# Altium footprint library HW_HOLLAND_NCDM_MONITOR_R1.PcbLib: 472 footprints (part 15 of 30)
Each footprint in its own frame and in the unit in brackets; x right, y up, seen from the top. Pads: shape width x height; smd on the part's side, far side on the other; paste and mask are expansions set on the pad; w line width, h text height; cw(c..) or ccw(c..) is an arc to the next point about the centre after c.
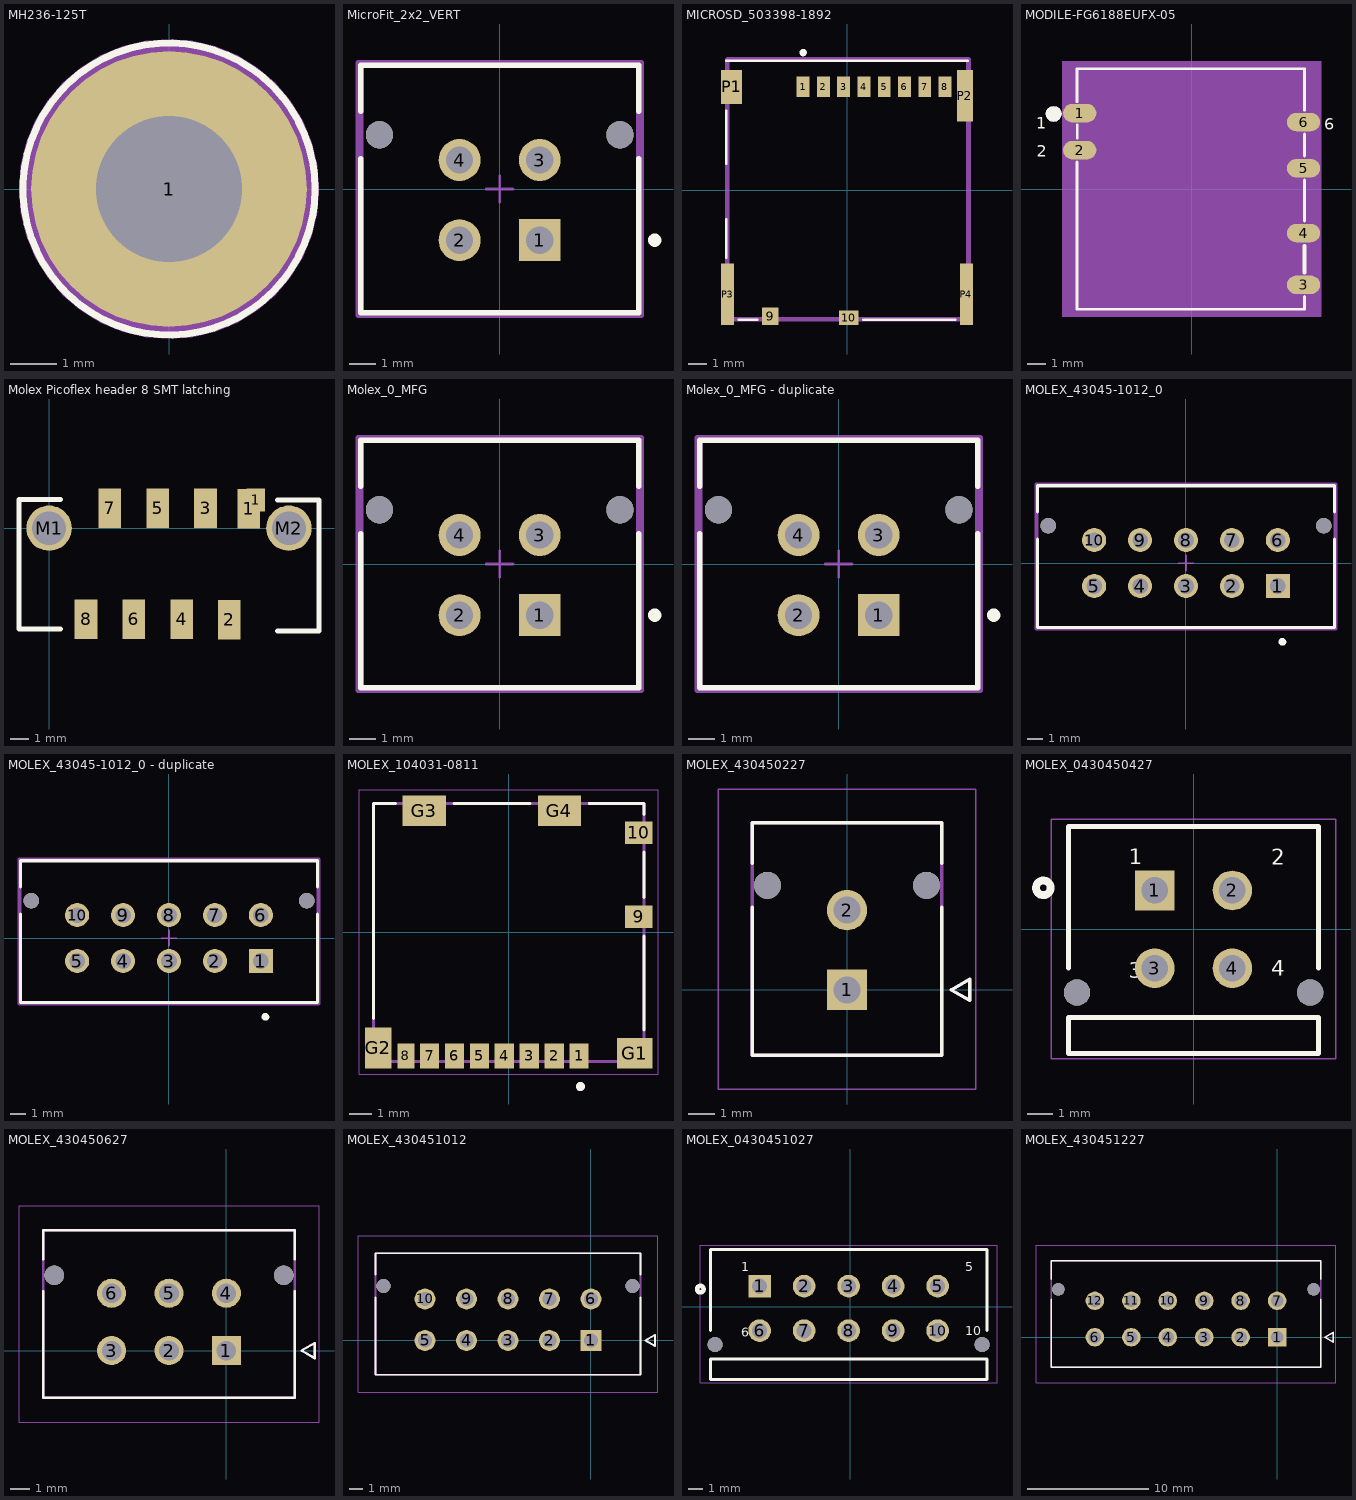
[diagram p14: the footprints below, top view; thin cyan lines are the x and y axes]

## MH236-125T [mil]
pads (1):
  round 236 hole 125: 1(0,0)
Top Overlay:
  circle w6: c0,0 r125.01
  text ".Designator" at -40,8.34 h25
Top Assembly:
  circle w6: c0,0 r118
  text ".Designator" at -40,8.34 h25
Top 3D Body:
  region: 118.36,0 116.91,-18.52 112.57,-36.58 105.46,-53.74 95.76,-69.57 83.7,-83.7 69.57,-95.76 53.74,-105.46 36.58,-112.57 18.52,-116.91 0,-118.36 -18.52,-116.91 -36.58,-112.57 -53.74,-105.46 -59.02,-102.23 -69.57,-95.76 -83.7,-83.7 -95.76,-69.57 -105.46,-53.74 -112.57,-36.58 -116.91,-18.52 -118.36,0 -116.91,18.52 -112.57,36.58 -105.46,53.74 -95.76,69.57 -83.7,83.7 -69.57,95.76 -59.02,102.23 -53.74,105.46 -36.58,112.57 -18.52,116.91 0,118.36 18.52,116.91 36.58,112.57 53.74,105.46 69.57,95.76 83.7,83.7 95.76,69.57 105.46,53.74 112.57,36.58 116.91,18.52
Bottom 3D Body:
  region: 118.36,0 116.91,-18.52 112.57,-36.58 105.46,-53.74 95.76,-69.57 83.7,-83.7 69.57,-95.76 53.74,-105.46 36.58,-112.57 18.52,-116.91 0,-118.36 -18.52,-116.91 -36.58,-112.57 -53.74,-105.46 -59.02,-102.23 -69.57,-95.76 -83.7,-83.7 -95.76,-69.57 -105.46,-53.74 -112.57,-36.58 -116.91,-18.52 -118.36,0 -116.91,18.52 -112.57,36.58 -105.46,53.74 -95.76,69.57 -83.7,83.7 -69.57,95.76 -59.02,102.23 -53.74,105.46 -36.58,112.57 -18.52,116.91 0,118.36 18.52,116.91 36.58,112.57 53.74,105.46 69.57,95.76 83.7,83.7 95.76,69.57 105.46,53.74 112.57,36.58 116.91,18.52
Top Component Center:
  lines w1: -10,0 10,0 ; 0,-10 0,10
Top Courtyard:
  dashed: 118.36,0 116.91,-18.52 112.57,-36.58 105.46,-53.74 95.76,-69.57 83.7,-83.7 69.57,-95.76 53.74,-105.46 36.58,-112.57 18.52,-116.91 0,-118.36 -18.52,-116.91 -36.58,-112.57 -53.74,-105.46 -59.02,-102.23 -69.57,-95.76 -83.7,-83.7 -95.76,-69.57 -105.46,-53.74 -112.57,-36.58 -116.91,-18.52 -118.36,0 -116.91,18.52 -112.57,36.58 -105.46,53.74 -95.76,69.57 -83.7,83.7 -69.57,95.76 -59.02,102.23 -53.74,105.46 -36.58,112.57 -18.52,116.91 0,118.36 18.52,116.91 36.58,112.57 53.74,105.46 69.57,95.76 83.7,83.7 95.76,69.57 105.46,53.74 112.57,36.58 116.91,18.52
Bottom Courtyard:
  dashed: 118.36,0 116.91,-18.52 112.57,-36.58 105.46,-53.74 95.76,-69.57 83.7,-83.7 69.57,-95.76 53.74,-105.46 36.58,-112.57 18.52,-116.91 0,-118.36 -18.52,-116.91 -36.58,-112.57 -53.74,-105.46 -59.02,-102.23 -69.57,-95.76 -83.7,-83.7 -95.76,-69.57 -105.46,-53.74 -112.57,-36.58 -116.91,-18.52 -118.36,0 -116.91,18.52 -112.57,36.58 -105.46,53.74 -95.76,69.57 -83.7,83.7 -69.57,95.76 -59.02,102.23 -53.74,105.46 -36.58,112.57 -18.52,116.91 0,118.36 18.52,116.91 36.58,112.57 53.74,105.46 69.57,95.76 83.7,83.7 95.76,69.57 105.46,53.74 112.57,36.58 116.91,18.52
Mechanical 17:
  text "1" at -14.4,0 h18
Mechanical 23:
  dashed: 128.4,0 126.81,-20.09 122.11,-39.68 114.4,-58.29 103.87,-75.47 90.79,-90.79 75.47,-103.87 58.29,-114.4 39.68,-122.11 20.09,-126.81 0,-128.4 -20.09,-126.81 -39.68,-122.11 -58.29,-114.4 -64.02,-110.89 -75.47,-103.87 -90.79,-90.79 -103.87,-75.47 -114.4,-58.29 -122.11,-39.68 -126.81,-20.09 -128.4,0 -126.81,20.09 -122.11,39.68 -114.4,58.29 -103.87,75.47 -90.79,90.79 -75.47,103.87 -64.02,110.89 -58.29,114.4 -39.68,122.11 -20.09,126.81 0,128.4 20.09,126.81 39.68,122.11 58.29,114.4 75.47,103.87 90.79,90.79 103.87,75.47 114.4,58.29 122.11,39.68 126.81,20.09
Mechanical 25:
  dashed: 128.4,0 126.81,-20.09 122.11,-39.68 114.4,-58.29 103.87,-75.47 90.79,-90.79 75.47,-103.87 58.29,-114.4 39.68,-122.11 20.09,-126.81 0,-128.4 -20.09,-126.81 -39.68,-122.11 -58.29,-114.4 -64.02,-110.89 -75.47,-103.87 -90.79,-90.79 -103.87,-75.47 -114.4,-58.29 -122.11,-39.68 -126.81,-20.09 -128.4,0 -126.81,20.09 -122.11,39.68 -114.4,58.29 -103.87,75.47 -90.79,90.79 -75.47,103.87 -64.02,110.89 -58.29,114.4 -39.68,122.11 -20.09,126.81 0,128.4 20.09,126.81 39.68,122.11 58.29,114.4 75.47,103.87 90.79,90.79 103.87,75.47 114.4,58.29 122.11,39.68 126.81,20.09
3D body: height 150, standoff 0, extent -118.36,-118.36 118.36,118.36
3D body: height 150, standoff 0, extent -118.36,-118.36 118.36,118.36

## MicroFit_2x2_VERT [mm]
pads (6):
  rect 1.57x1.57 hole 1.02 paste-2539.97 mask+0: 1(1.5,-1.915)
  round 1.57 hole 1.02 paste-2539.97 mask+0: 2(-1.5,-1.915) 3(1.5,1.085) 4(-1.5,1.085)
  round 1.02 hole 1.02 unplated paste-2539.97 mask+0: ""(-4.5,2.025) ""(4.5,2.025)
Top Overlay:
  circle w0.25: c5.8,-1.915 r0.125
  lines w0.2: -5.2,1.14 -5.2,-4.635 5.2,-4.635 5.2,1.14 ; -5.2,2.91 -5.2,4.635 5.2,4.635 5.2,2.91
Top Courtyard:
  lines w0.2: -5.3,-4.735 5.3,-4.735 5.3,4.735 -5.3,4.735 -5.3,-4.735
  text ".Designator" at 0,0.046 h1.25
Mechanical 12:
  lines w0.2: -5.2,-4.635 5.2,-4.635 5.2,4.635 -5.2,4.635 -5.2,-4.635
Mechanical 15:
  lines w0.1: -0.5,0 0.5,0 ; 0,-0.5 0,0.5
  lines w0.2: -5.3,-4.735 5.3,-4.735 5.3,4.735 -5.3,4.735 -5.3,-4.735
3D body "Conn_Molex_43045-0427_eec.STEP": height 0.25, standoff 0, extent -5.3,-4.735 5.3,4.735

## MICROSD_503398-1892 [mm]
height 0.52
pads (14):
  rect 0.7x1.1 smd: 1(-2.38,5.625) 2(-1.28,5.625) 3(-0.18,5.625) 4(0.92,5.625) 5(2.02,5.625) 6(3.12,5.625) 7(4.22,5.625) 8(5.32,5.625)
  rect 0.9x0.93 smd: 9(-4.17,-6.84)
  rect 1.05x0.78 smd: 10(0.095,-6.915)
  rect 1.14x1.83 smd: P1(-6.26,5.61)
  rect 0.86x2.8 smd: P2(6.4,5.125)
  rect 0.7x3.33 smd: P3(-6.48,-5.64) P4(6.48,-5.64)
Top Overlay:
  circle w0.2: c-2.38,7.475 r0.1
  lines w0.127: -6.55,-3.675 -6.55,-1.575 ; -6.55,1.425 -6.55,4.325 ; -6.55,7.025 6.55,7.025 ; -5.876,-7.025 -4.874,-7.025 ; 0.874,-7.025 5.876,-7.025
Mechanical 13:
  circle w0.2: c-2.38,5.775 r0.1
  lines w0.127: -6.55,-7.025 -6.55,7.025 6.55,7.025 6.55,-7.025 -6.55,-7.025
Top Designator:
  lines w0.254: -6.5,-7 6.6,-7 6.6,7.1 -6.5,7.1 -6.5,-7
  text ".Designator" at -4.835,-0.634 h1
3D body "5033981892.stp": height 1.28, standoff 0, extent -6.5,-7.025 6.6,7.025

## MODILE-FG6188EUFX-05 [mm]
pads (6):
  oval 1.8x1 smd: 1(-6.05,4.1) 2(-6.05,2.1) 3(6.05,-5.18) 4(6.05,-2.38) 5(6.05,1.12) 6(6.05,3.62)
Top Overlay:
  dashed: -7.034,4.06 -7.066,4.221 -7.158,4.358 -7.294,4.449 -7.456,4.481 -7.617,4.449 -7.663,4.419 -7.754,4.358 -7.845,4.221 -7.877,4.06 -7.845,3.898 -7.754,3.761 -7.663,3.701 -7.617,3.67 -7.456,3.638 -7.294,3.67 -7.158,3.761 -7.066,3.898
  lines w0.152: -6.2,4.717 -6.2,6.5 6.1,6.5 6.1,4.252 ; -6.193,1.468 -6.2,-6.5 6.1,-6.5 6.1,-5.817 ; -6.186,2.74 -6.186,3.473 ; 6.095,1.784 6.095,2.971 ; 6.104,-1.734 6.104,0.478
  lines w0.203: 6.095,-4.511 6.1,-3.063
  text "6" at 7.167,3.19 h0.64
  text "1" at -8.412,3.247 h0.64
  text "2" at -8.369,1.736 h0.64
  text ".Designator" at -0.953,-0.212 h0.64
Top Assembly:
  dashed: -7.034,4.06 -7.066,4.221 -7.158,4.358 -7.294,4.449 -7.456,4.481 -7.617,4.449 -7.663,4.419 -7.754,4.358 -7.845,4.221 -7.877,4.06 -7.845,3.898 -7.754,3.761 -7.663,3.701 -7.617,3.67 -7.456,3.638 -7.294,3.67 -7.158,3.761 -7.066,3.898
  lines w0.025: -6.1,-6.5 6.1,-6.5 6.1,6.5 -6.1,6.5 -6.1,-6.5
Top 3D Body:
  region: -7,6.9 7,6.9 7,-6.9 -7,-6.9
Mechanical 17:
  text "3" at 5.867,-5.18 h0.46
  text "4" at 5.867,-2.38 h0.46
  text "5" at 5.867,1.12 h0.46
  text "2" at -6.233,2.1 h0.46
  text "1" at -6.233,4.1 h0.46
  text "6" at 5.867,3.62 h0.46
3D body: height 3.81, standoff 0, extent -7,-6.9 7,6.9

## Molex Picoflex header 8 SMT latching [mm]
pads (11):
  rect 1.2x2.1 smd: 1(10.617,1.041) 2(9.58,-4.855) 3(8.31,1.05) 4(7.04,-4.845) 5(5.77,1.05) 6(4.5,-4.845) 7(3.23,1.05) 8(1.96,-4.845)
  rect 1x1.2 smd: 1(10.977,1.499)
  round 2.413 hole 1.8 mask-0.3: M1(0,0) M2(12.74,0)
Top Overlay:
  lines w0.254: 0.6,-5.359 -1.6,-5.359 -1.6,1.524 0.6,1.524 ; 12.14,-5.461 14.34,-5.461 14.34,1.499 12.14,1.499
3D body "908163008.stp": height 8.45, standoff -1.25, extent -1.595,-5.375 14.345,1.545

## Molex_0_MFG [mm]
pads (6):
  rect 1.57x1.57 hole 1.02 paste-2539.97 mask+0: 1(1.5,-1.915)
  round 1.57 hole 1.02 paste-2539.97 mask+0: 2(-1.5,-1.915) 3(1.5,1.085) 4(-1.5,1.085)
  round 1.02 hole 1.02 unplated paste-2539.97 mask+0: ""(-4.5,2.025) ""(4.5,2.025)
Top Overlay:
  circle w0.25: c5.8,-1.915 r0.125
  lines w0.2: -5.2,1.14 -5.2,-4.635 5.2,-4.635 5.2,1.14 ; -5.2,2.91 -5.2,4.635 5.2,4.635 5.2,2.91
Top Courtyard:
  lines w0.2: -5.3,-4.735 -5.3,4.735 5.3,4.735 5.3,-4.735 -5.3,-4.735
  text ".Designator" at 0,0 h1
Mechanical 12:
  lines w0.2: -5.2,-4.635 -5.2,4.635 5.2,4.635 5.2,-4.635 -5.2,-4.635
Mechanical 15:
  lines w0.1: -0.5,0 0.5,0 ; 0,-0.5 0,0.5
  lines w0.2: -5.3,-4.735 -5.3,4.735 5.3,4.735 5.3,-4.735 -5.3,-4.735
3D body "Conn_Molex_43045-0427_eec.STEP": height 0.25, standoff 0, extent -5.3,-4.735 5.3,4.735

## Molex_0_MFG - duplicate [mm]
pads (6):
  rect 1.57x1.57 hole 1.02 paste-2539.97 mask+0: 1(1.5,-1.915)
  round 1.57 hole 1.02 paste-2539.97 mask+0: 2(-1.5,-1.915) 3(1.5,1.085) 4(-1.5,1.085)
  round 1.02 hole 1.02 unplated paste-2539.97 mask+0: ""(-4.5,2.025) ""(4.5,2.025)
Top Overlay:
  circle w0.25: c5.8,-1.915 r0.125
  lines w0.2: -5.2,1.14 -5.2,-4.635 5.2,-4.635 5.2,1.14 ; -5.2,2.91 -5.2,4.635 5.2,4.635 5.2,2.91
Top Courtyard:
  lines w0.2: -5.3,-4.735 -5.3,4.735 5.3,4.735 5.3,-4.735 -5.3,-4.735
  text ".Designator" at 0,0 h1
Mechanical 12:
  lines w0.2: -5.2,-4.635 -5.2,4.635 5.2,4.635 5.2,-4.635 -5.2,-4.635
Mechanical 15:
  lines w0.1: -0.5,0 0.5,0 ; 0,-0.5 0,0.5
  lines w0.2: -5.3,-4.735 -5.3,4.735 5.3,4.735 5.3,-4.735 -5.3,-4.735
3D body "Conn_Molex_43045-0427_eec.STEP": height 0.25, standoff 0, extent -5.3,-4.735 5.3,4.735

## MOLEX_43045-1012_0 [mm]
pads (12):
  rect 1.57x1.57 hole 1.02 paste-2539.97 mask+0: 1(6,-1.5)
  round 1.57 hole 1.02 paste-2539.97 mask+0: 2(3,-1.5) 3(0,-1.5) 4(-3,-1.5) 5(-6,-1.5) 6(6,1.5) 7(3,1.5) 8(0,1.5) 9(-3,1.5) 10(-6,1.5)
  round 1.02 hole 1.02 unplated paste-2539.97 mask+0: ""(-9,2.44) ""(9,2.44)
Top Overlay:
  circle w0.25: c6.3,-5.15 r0.125
  lines w0.2: -9.7,1.555 -9.7,-4.22 9.7,-4.22 9.7,1.555 ; -9.7,3.325 -9.7,5.05 9.7,5.05 9.7,3.325
Top Courtyard:
  lines w0.2: -9.8,-4.32 9.8,-4.32 9.8,5.15 -9.8,5.15 -9.8,-4.32
  text ".Designator" at 0,0.415 h1
Mechanical 12:
  lines w0.15: -9.7,-4.22 9.7,-4.22 9.7,5.05 -9.7,5.05 -9.7,-4.22
Mechanical 15:
  lines w0.1: -0.5,0 0.5,0 ; 0,-0.5 0,0.5
  lines w0.2: -9.8,-4.32 9.8,-4.32 9.8,5.15 -9.8,5.15 -9.8,-4.32
3D body "Conn_Molex_43045-1012_eec.STEP": height 9.91, standoff -3.18, extent -9.575,-3.967 9.575,4.803

## MOLEX_43045-1012_0 - duplicate [mm]
pads (12):
  rect 1.57x1.57 hole 1.02 paste-2539.97 mask+0: 1(6,-1.5)
  round 1.57 hole 1.02 paste-2539.97 mask+0: 2(3,-1.5) 3(0,-1.5) 4(-3,-1.5) 5(-6,-1.5) 6(6,1.5) 7(3,1.5) 8(0,1.5) 9(-3,1.5) 10(-6,1.5)
  round 1.02 hole 1.02 unplated paste-2539.97 mask+0: ""(-9,2.44) ""(9,2.44)
Top Overlay:
  circle w0.25: c6.3,-5.15 r0.125
  lines w0.2: -9.7,1.555 -9.7,-4.22 9.7,-4.22 9.7,1.555 ; -9.7,3.325 -9.7,5.05 9.7,5.05 9.7,3.325
Top Courtyard:
  lines w0.2: -9.8,-4.32 9.8,-4.32 9.8,5.15 -9.8,5.15 -9.8,-4.32
  text ".Designator" at 0,0.415 h1
Mechanical 12:
  lines w0.15: -9.7,-4.22 9.7,-4.22 9.7,5.05 -9.7,5.05 -9.7,-4.22
Mechanical 15:
  lines w0.1: -0.5,0 0.5,0 ; 0,-0.5 0,0.5
  lines w0.2: -9.8,-4.32 9.8,-4.32 9.8,5.15 -9.8,5.15 -9.8,-4.32
3D body "Conn_Molex_43045-1012_eec.STEP": height 9.91, standoff -3.18, extent -9.575,-3.967 9.575,4.803

## MOLEX_104031-0811 [mm]
height 1.57
pads (14):
  rect 0.85x1.1 smd: 1(3.105,-5.45) 2(2.005,-5.45) 3(0.905,-5.45) 4(-0.195,-5.45) 5(-1.295,-5.45) 6(-2.395,-5.45) 7(-3.495,-5.45)
  rect 0.75x1.1 smd: 8(-4.545,-5.45)
  rect 1.2x1 smd: 9(5.74,0.7) 10(5.74,4.4)
  rect 1.55x1.35 smd: G1(5.565,-5.325)
  rect 1.17x1.8 smd: G2(-5.755,-5.1)
  rect 1.9x1.35 smd: G3(-3.73,5.375) G4(2.24,5.375)
Top Overlay:
  circle w0.2: c3.168,-6.801 r0.1
  lines w0.127: -5.975,-3.806 -5.975,5.7 -5.003,5.7 ; -2.413,5.7 0.939,5.7 ; 3.556,5.7 5.975,5.7 5.975,5.211 ; 5.975,-4.3 5.975,-0.15 ; 5.975,1.55 5.975,3.55
Mechanical 13:
  circle w0.2: c3.168,-6.801 r0.1
  lines w0.127: -5.975,-5.7 5.975,-5.7 5.975,5.7 -5.975,5.7 -5.975,-5.7
Mechanical 15:
  lines w0.05: -6.59,-6.25 6.59,-6.25 6.59,6.3 -6.59,6.3 -6.59,-6.25
3D body "1040310811.stp": height 1.43, standoff -0.02, extent -5.975,-5.7 5.975,5.7

## MOLEX_430450227 [mm]
height 9.91
pads (4):
  rect 1.52x1.52 / inner round 1.52 / far side rect 1.52x1.52 hole 1.02 mask+0.076: 1(0,0)
  round 1.52 hole 1.02 mask+0.076: 2(0,3)
  round 1.02 hole 1.02 unplated mask+0.076: ""(-3,3.94) ""(3,3.94)
Top Overlay:
  lines w0.127: -3.575,3.11 -3.575,-2.47 3.575,-2.47 3.575,3.11 ; -3.575,4.77 -3.575,6.3 3.575,6.3 3.575,4.77 ; 3.93,0 4.63,-0.4 4.63,0.4 3.93,0
Mechanical 13:
  lines w0.127: -3.575,-2.47 -3.575,6.3 3.575,6.3 3.575,-2.47 -3.575,-2.47 ; 3.93,0 4.63,-0.4 4.63,0.4 3.93,0
  text "NPTH D1.02 +/- 0.05" at -3.5,-6.24 h0.5
  text "PTH D1.02 +/- 0.05" at -3.5,-5.47 h0.5
Mechanical 15:
  lines w0.05: -4.845,-3.74 -4.845,7.57 4.845,7.57 4.845,-3.74 -4.845,-3.74
3D body "430450227.step": height 9.92, standoff -3.17, extent -3.575,-2.47 3.575,6.3

## MOLEX_0430450427 [mm]
pads (6):
  rect 1.53x1.53 hole 1.02: 1(-1.5,1.5)
  round 1.53 hole 1.02: 2(1.5,1.5) 3(-1.5,-1.5) 4(1.5,-1.5)
  round 1.02 hole 1.02 unplated: ""(-4.5,-2.44) ""(4.5,-2.44)
Top Overlay:
  circle w0.3: c-5.8,1.6 r0.283
  lines w0.2: -4.825,-1.5 -4.825,3.97 4.825,3.97 4.825,-1.5 ; -4.825,-4.8 -4.825,-3.4 4.825,-3.4 4.825,-4.8 -4.825,-4.8
  text "4" at 3.003,-1.802 h0.61
  text "3" at -2.5,-1.9 h0.61
  text "2" at 3.002,2.501 h0.61
  text "1" at -2.503,2.503 h0.61
Mechanical 15:
  lines w0.05: -5.5,-5 -5.5,4.25 5.5,4.25 5.5,-5 -5.5,-5
3D body "step_temp.STEP": height 9.92, standoff -3.17, extent -5.075,-4.833 5.075,3.937

## MOLEX_430450627 [mm]
height 9.91
pads (8):
  rect 1.52x1.52 / inner round 1.52 / far side rect 1.52x1.52 hole 1.02 mask+0.076: 1(0,0)
  round 1.52 hole 1.02 mask+0.076: 2(-3,0) 3(-6,0) 4(0,3) 5(-3,3) 6(-6,3)
  round 1.02 hole 1.02 unplated mask+0.076: ""(-9,3.94) ""(3,3.94)
Top Overlay:
  lines w0.127: -9.575,3.11 -9.575,-2.47 3.575,-2.47 3.575,3.11 ; -9.575,4.77 -9.575,6.3 3.575,6.3 3.575,4.77 ; 3.93,0 4.63,0.4 4.63,-0.4 3.93,0
Mechanical 13:
  lines w0.127: -9.575,-2.47 3.575,-2.47 3.575,6.3 -9.575,6.3 -9.575,-2.47 ; 3.93,0 4.63,0.4 4.63,-0.4 3.93,0
  text "PTH D1.02 +/- 0.05" at -9.5,-5.47 h0.5
  text "NPTH D1.02 +/- 0.05" at -9.5,-6.24 h0.5
Mechanical 15:
  lines w0.05: -10.845,-3.74 4.845,-3.74 4.845,7.57 -10.845,7.57 -10.845,-3.74
3D body "43045-0627--3DModel-STEP-56544.STEP": height 9.92, standoff -3.17, extent -9.575,-2.47 3.575,6.3

## MOLEX_430451012 [mm]
height 9.91
pads (12):
  rect 1.52x1.52 / inner round 1.52 / far side rect 1.52x1.52 hole 1.02 mask+0.076: 1(0,0)
  round 1.52 hole 1.02 mask+0.076: 2(-3,0) 3(-6,0) 4(-9,0) 5(-12,0) 6(0,3) 7(-3,3) 8(-6,3) 9(-9,3) 10(-12,3)
  round 1.02 hole 1.02 unplated mask+0.076: ""(-15,3.94) ""(3,3.94)
Top Overlay:
  lines w0.127: -15.575,3.11 -15.575,-2.47 3.575,-2.47 3.575,3.11 ; -15.575,4.77 -15.575,6.3 3.575,6.3 3.575,4.77 ; 3.93,0 4.63,-0.4 4.63,0.4 3.93,0
Mechanical 13:
  lines w0.127: -15.575,-2.47 -15.575,6.3 3.575,6.3 3.575,-2.47 -15.575,-2.47 ; 3.93,0 4.63,-0.4 4.63,0.4 3.93,0
  text "NPTH D1.02 +/- 0.05" at -15.5,-6.24 h0.5
  text "PTH D1.02 +/- 0.05" at -15.5,-5.47 h0.5
Mechanical 15:
  lines w0.05: -16.845,-3.74 -16.845,7.57 4.845,7.57 4.845,-3.74 -16.845,-3.74
3D body "0430451012.stp": height 9.92, standoff -3.17, extent -15.544,-2.42 3.606,6.35

## MOLEX_0430451027 [mm]
pads (12):
  rect 1.53x1.53 hole 1.02: 1(-6.1,1.4)
  round 1.53 hole 1.02: 2(-3.1,1.4) 3(-0.1,1.4) 4(2.9,1.4) 5(5.9,1.4) 6(-6.1,-1.6) 7(-3.1,-1.6) 8(-0.1,-1.6) 9(2.9,-1.6) 10(5.9,-1.6)
  round 1.02 hole 1.02 unplated: ""(-9.1,-2.54) ""(8.9,-2.54)
Top Overlay:
  circle w0.3: c-10.1,1.2 r0.224
  lines w0.2: -9.425,-1.6 -9.425,3.87 9.225,3.87 9.225,-1.6 ; -9.425,-4.9 -9.425,-3.5 9.225,-3.5 9.225,-4.9 -9.425,-4.9
  text "10" at 7.763,-1.903 h0.61
  text "6" at -7.351,-2 h0.61
  text "5" at 7.759,2.403 h0.61
  text "1" at -7.351,2.4 h0.61
Mechanical 15:
  lines w0.05: -10.1,-5.1 -10.1,4.15 9.9,4.15 9.9,-5.1 -10.1,-5.1
3D body "0430451027--3DModel-STEP-231308.STEP": height 9.92, standoff -3.17, extent -9.652,-4.893 9.498,3.877

## MOLEX_430451227 [mm]
height 9.91
pads (14):
  rect 1.52x1.52 / inner round 1.52 / far side rect 1.52x1.52 hole 1.02 mask+0.076: 1(0,0)
  round 1.52 hole 1.02 mask+0.076: 2(-3,0) 3(-6,0) 4(-9,0) 5(-12,0) 6(-15,0) 7(0,3) 8(-3,3) 9(-6,3) 10(-9,3) 11(-12,3) 12(-15,3)
  round 1.02 hole 1.02 unplated mask+0.076: ""(-18,3.94) ""(3,3.94)
Top Overlay:
  lines w0.127: -18.575,3.11 -18.575,-2.47 3.575,-2.47 3.575,3.11 ; -18.575,4.77 -18.575,6.3 3.575,6.3 3.575,4.77 ; 3.93,0 4.63,0.4 4.63,-0.4 3.93,0
Mechanical 13:
  lines w0.127: -18.575,-2.47 3.575,-2.47 3.575,6.3 -18.575,6.3 -18.575,-2.47 ; 3.93,0 4.63,0.4 4.63,-0.4 3.93,0
  text "PTH D1.02 +/- 0.05" at -18.5,-5.47 h0.5
  text "NPTH D1.02 +/- 0.05" at -18.5,-6.24 h0.5
Mechanical 15:
  lines w0.05: -19.845,-3.74 4.845,-3.74 4.845,7.57 -19.845,7.57 -19.845,-3.74
3D body "0430451227.stp": height 9.92, standoff -3.17, extent -18.568,-2.446 3.582,6.324